# Altium footprint library Footprint_Library.PcbLib: 25 footprints (part 1 of 2)
Each footprint in its own frame and in the unit in brackets; x right, y up, seen from the top. Pads: shape width x height; smd on the part's side, far side on the other; paste and mask are expansions set on the pad; w line width, h text height; cw(c..) or ccw(c..) is an arc to the next point about the centre after c.
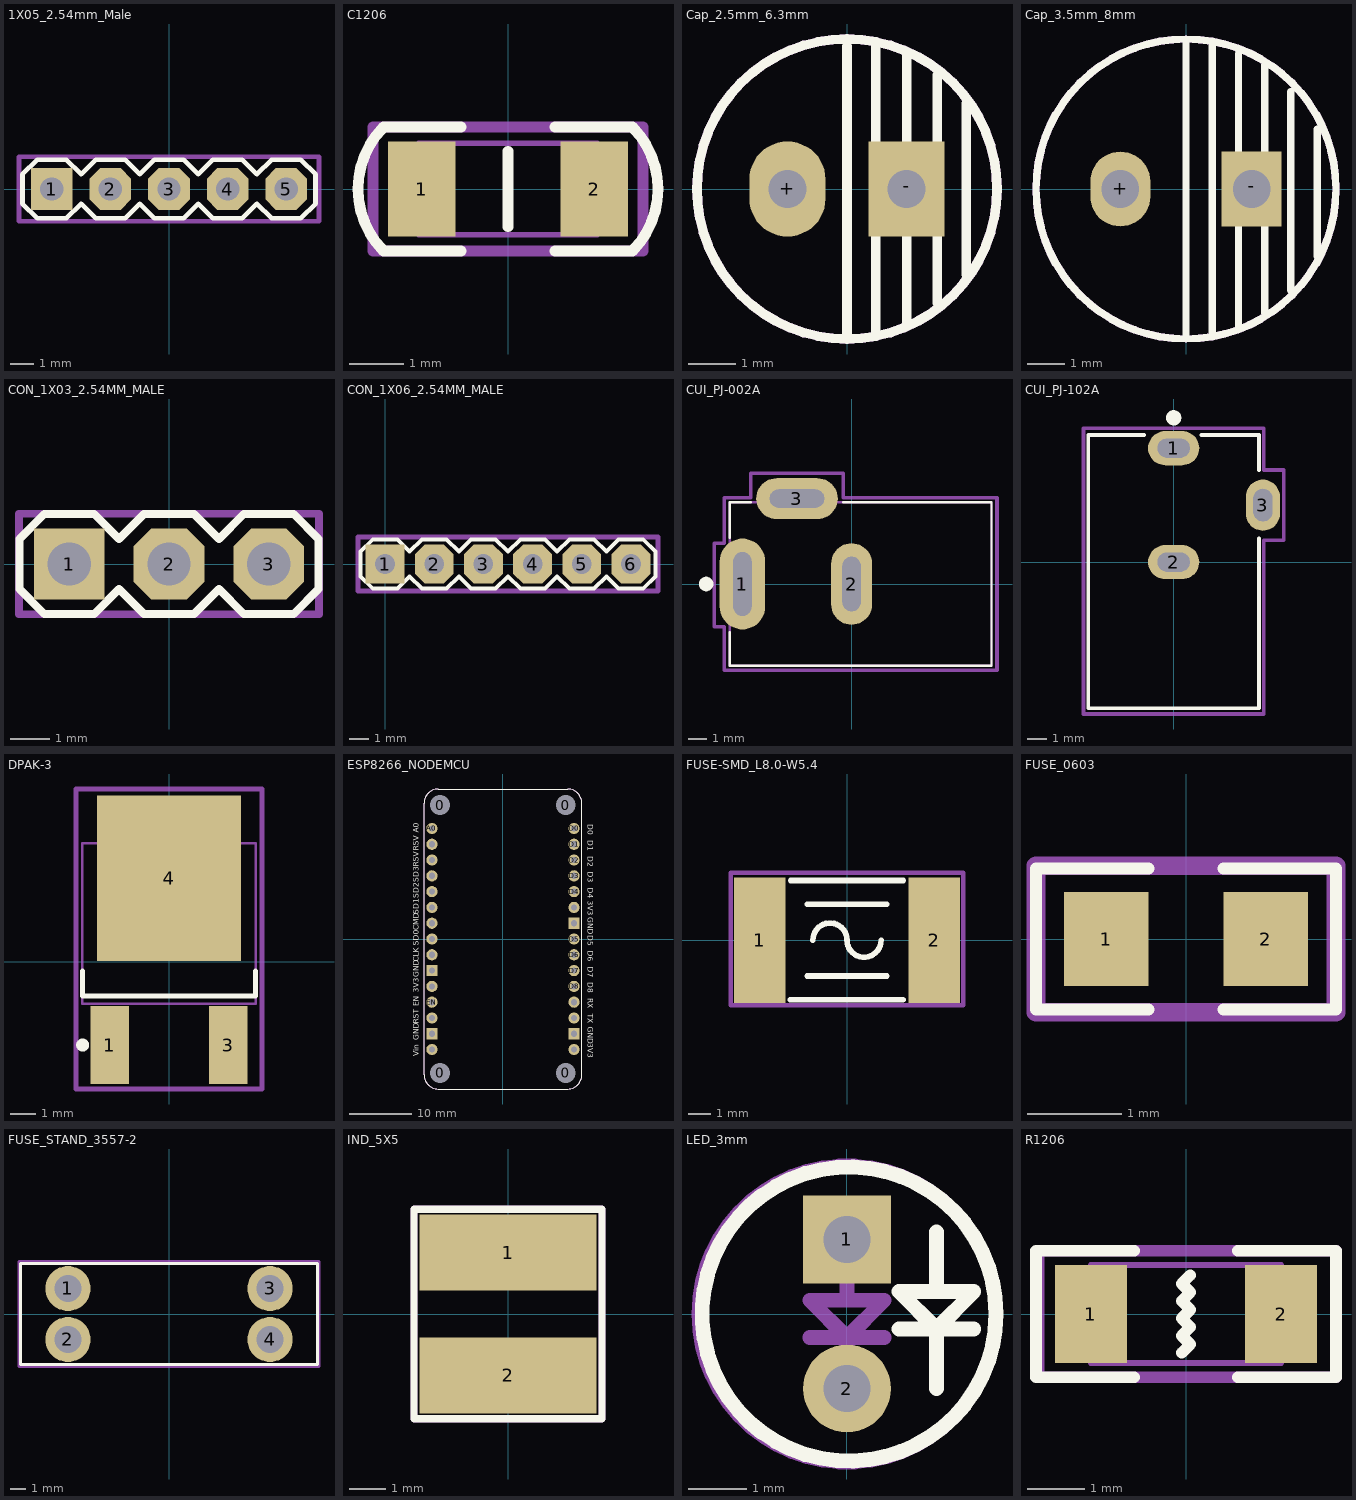
[diagram p0: the footprints below, top view; thin cyan lines are the x and y axes]

## 1X05_2.54mm_Male [mm]
pads (5):
  rect 1.8x1.8 hole 1.016: 1(-5.08,0)
  oct 1.8x1.8 hole 1.016: 2(-2.54,0) 3(0,0) 4(2.54,0) 5(5.08,0)
Top Overlay:
  lines w0.203: -6.35,-0.635 -6.35,0.635 -5.715,1.27 -4.445,1.27 -3.81,0.635 -3.175,1.27 -1.905,1.27 -1.27,0.635 -0.635,1.27 0.635,1.27 1.27,0.635 1.905,1.27 3.175,1.27 3.81,0.635 4.445,1.27 5.715,1.27 6.35,0.635 6.35,-0.635 5.715,-1.27 4.445,-1.27 3.81,-0.635 3.175,-1.27 1.905,-1.27 1.27,-0.635 0.635,-1.27 -0.635,-1.27 -1.27,-0.635 -1.905,-1.27 -3.175,-1.27 -3.81,-0.635 -4.445,-1.27 -5.715,-1.27 -6.35,-0.635
Mechanical 2:
  lines w0.2: -6.5,-1.4 6.5,-1.4 6.5,1.4 -6.5,1.4 -6.5,-1.4
  text "'.Designator'" at -4.1,-0.4 h1
Mechanical 16:
  rectangle: 4.826,-0.254 5.334,0.254
  rectangle: 2.286,-0.254 2.794,0.254
  rectangle: -0.254,-0.254 0.254,0.254
  rectangle: -2.794,-0.254 -2.286,0.254
  rectangle: -5.334,-0.254 -4.826,0.254
3D body "DS1021-1x5S61.stp": height 8.6, standoff -3, extent -6.35,-1.27 6.35,1.27

## C1206 [mm] "Chip Capacitor, 2-Leads, Body 3.20x1.60mm, IPC Medium Density"
height 0.6
pads (2):
  rect 1.25x1.75 smd: 1(-1.6,0) 2(1.6,0)
Top Overlay:
  lines w0.2: -0.87,-1.15 -2.3,-1.15 cw(c-1.15,0) -2.3,1.15 -0.87,1.15 ; 0,-0.7 0,0.7 ; 0.87,-1.15 2.3,-1.15 ccw(c1.15,0) 2.3,1.15 0.87,1.15
Mechanical 2:
  lines w0.2: -2.5,-1.15 -2.5,1.15 2.5,1.15 2.5,-1.15 -2.5,-1.15
  text "'.Designator'" at -1.65,-0.6 h1
Mechanical 13:
  lines w0.1: -1.65,-0.85 1.65,-0.85 1.65,0.85 -1.65,0.85 -1.65,-0.85
3D body "CAPC3216X06N.step": height 0.6, standoff 0, extent -1.65,-0.85 1.65,0.85

## Cap_2.5mm_6.3mm [mm]
pads (2):
  oval 1.6x2 hole 0.8: +(-1.25,0)
  rect 1.6x2 hole 0.8: -(1.25,0)
Top Overlay:
  circle w0.2: c0,0 r3.15
  lines w0.2: 0,-3.1 0,3 ; 0.6,-3 0.6,3 ; 1.25,-2.8 1.25,2.8 ; 1.9,-2.4 1.9,2.4 ; 2.5,-1.8 2.5,1.8
Mechanical 2:
  circle w0.2: c0,0 r3.15
  text "'.Designator'" at -2.5,1 h1
  text "+" at -1.7,-0.4 h1
3D body "Capacitor aluminum electrolytic radial 6,3x12mm 2,5mm pitch.STEP": height 12.11, standoff -2.9, extent -3.16,-3.15 3.15,3.15

## Cap_3.5mm_8mm [mm]
pads (2):
  oval 1.6x2 hole 1: +(-1.75,0)
  rect 1.6x2 hole 1: -(1.75,0)
Top Overlay:
  circle w0.2: c0,0 r4
  lines w0.2: 0,-3.9 0,3.9 ; 0.7,-3.8 0.7,3.8 ; 1.4,-3.7 1.4,3.6 ; 2.1,-3.3 2.1,3.3 ; 2.8,-2.7 2.8,2.6 ; 3.5,-1.8 3.5,1.6
Mechanical 2:
  circle w0.2: c0,0 r4
  text "'.Designator'" at -2.5,1 h1
  text "+" at -2.2,-0.4 h1
3D body "Capacitor aluminum electrolytic radial 8x18mm 3,5mm pitch.STEP": height 18.11, standoff -2.9, extent -4,-4 4.01,4

## CON_1X03_2.54MM_MALE [mm]
pads (3):
  rect 1.8x1.8 hole 1.1: 1(-2.54,0)
  oct 1.8x1.8 hole 1.1: 2(0,0) 3(2.54,0)
Top Overlay:
  lines w0.203: -3.81,-0.635 -3.175,-1.27 -1.905,-1.27 -1.27,-0.635 -0.635,-1.27 0.635,-1.27 1.27,-0.635 1.905,-1.27 3.175,-1.27 3.81,-0.635 3.81,0.635 3.175,1.27 1.905,1.27 1.27,0.635 0.635,1.27 -0.635,1.27 -1.27,0.635 -1.905,1.27 -3.175,1.27 -3.81,0.635 -3.81,-0.635
Mechanical 2:
  lines w0.2: -3.82,-1.28 -3.82,1.28 3.82,1.28 3.82,-1.28 -3.82,-1.28
  text "'.Designator'" at -2.9,-0.38 h1
3D body "DS1021-1x3S61.stp": height 8.6, standoff -3, extent -3.81,-1.27 3.81,1.27

## CON_1X06_2.54MM_MALE [mm]
pads (6):
  rect 2x2 hole 1.016: 1(0,0)
  oct 2x2 hole 1.016: 2(2.54,0) 3(5.08,0) 4(7.62,0) 5(10.16,0) 6(12.7,0)
Top Overlay:
  lines w0.203: -1.27,-0.635 -0.635,-1.27 0.635,-1.27 1.27,-0.635 1.905,-1.27 3.175,-1.27 3.81,-0.635 4.445,-1.27 5.715,-1.27 6.35,-0.635 6.985,-1.27 8.255,-1.27 8.89,-0.635 9.525,-1.27 10.795,-1.27 11.43,-0.635 12.065,-1.27 13.335,-1.27 13.97,-0.635 13.97,0.635 13.335,1.27 12.065,1.27 11.43,0.635 10.795,1.27 9.525,1.27 8.89,0.635 8.255,1.27 6.985,1.27 6.35,0.635 5.715,1.27 4.445,1.27 3.81,0.635 3.175,1.27 1.905,1.27 1.27,0.635 0.635,1.27 -0.635,1.27 -1.27,0.635 -1.27,-0.635
Mechanical 2:
  lines w0.254: -1.397,-1.397 14.097,-1.397 14.097,1.397 -1.397,1.397 -1.397,-1.397
  text "'.Designator'" at 2.235,-0.432 h1
3D body "DS1021-1x6S61.stp": height 8.6, standoff -3, extent -1.27,-1.27 13.97,1.27

## CUI_PJ-002A [mm] "Power Barrel Connector Jack 2.10mm ID (0.083\"), 5.50mm OD (0.217\") Through Hole, Right Angle"
pads (3):
  oval 2.5x5 hole 1 slot 3.5 at 90 deg: 1(-6,0)
  oval 2.25x4.5 hole 1 slot 3 at 90 deg: 2(0,0)
  oval 4.5x2.25 hole 1 slot 3 at 0 deg: 3(-3,4.7)
Top Overlay:
  circle w0.4: c-8,0 r0.2
  lines w0.127: -6.7,-2.65 -6.7,-4.5 7.7,-4.5 7.7,4.5 -0.45,4.5 ; -6.7,2.55 -6.7,4.5 -5.55,4.5
Mechanical 1:
  lines w0: -6.5,-1.75 -5.5,-1.75 -5.5,1.75 -6.5,1.75 -6.5,-1.75 ; -4.5,4.2 -4.5,5.2 -1.5,5.2 -1.5,4.2 -4.5,4.2 ; -0.5,-1.5 0.5,-1.5 0.5,1.5 -0.5,1.5 -0.5,-1.5
Mechanical 2:
  lines w0.2: -7.55,-2.35 -7.55,2.25 -7,2.25 -7,4.75 -5.55,4.75 -5.55,6.1 -0.45,6.1 -0.45,4.75 8,4.75 8,-4.75 -7,-4.75 -7,-2.35 -7.55,-2.35
  text "DC-JACK" at 7,-4.2 h2.25
  text "'.Designator'" at 2,-0.5 h1
Mechanical 13:
  lines w0.127: -6.7,-4.5 7.7,-4.5 ; -6.7,-4.5 7.7,-4.5 ; -6.7,-4.5 -6.7,4.5 ; -6.7,-4.5 -6.7,4.5 ; -6.7,4.5 7.7,4.5 ; -6.7,4.5 7.7,4.5 ; 7.7,-4.5 7.7,4.5 ; 7.7,-4.5 7.7,4.5
3D body "CUI_DEVICES_PJ-002A.step": height 11, standoff -3.5, extent -6.7,-4.5 7.7,4.9

## CUI_PJ-102A [mm] "Power Barrel Connector Jack 2.10mm ID (0.083\"), 5.50mm OD (0.217\") Through Hole, Right Angle"
pads (3):
  oval 2.7x1.8 hole 1 slot 1.7 at 0 deg: 1(0,6) 2(0,0)
  oval 1.8x2.7 hole 1 slot 1.7 at 90 deg: 3(4.7,3)
Top Overlay:
  circle w0.4: c0,7.6 r0.2
  lines w0.2: -1.55,6.7 -4.5,6.7 -4.5,-7.7 4.5,-7.7 4.5,1.25 ; 1.45,6.7 4.5,6.7 4.5,4.85
Mechanical 2:
  lines w0.2: -4.75,-8 -4.75,7.05 -2.35,7.05 2.25,7.05 4.75,7.05 4.75,4.85 5.8,4.85 5.8,1.15 4.75,1.15 4.75,-8 -4.75,-8
  text "'.Designator'" at -1.92,-3.57 h1
  text "DC-JACK" at -4.24,-7.03 h2.25
3D body "PJ-102AH--3DModel-STEP-56544.STEP": height 11, standoff -3.5, extent -4.5,-7.7 4.9,6.7

## DPAK-3 [mm] "D-PAK, 3-Pads, Body 6.20x6.72mm (max), IPC Medium Density"
height 2.38
pads (3):
  rect 1.5x3 smd: 1(-2.29,-3.225) 3(2.29,-3.225)
  rect 5.55x6.4 smd: 4(0,3.225)
Top Overlay:
  circle w0.25: c-3.34,-3.225 r0.125
  lines w0.2: -3.35,-0.375 -3.35,-1.325 3.35,-1.325 3.35,-0.375
Mechanical 2:
  lines w0.2: -3.6,-4.925 3.6,-4.925 3.6,6.675 -3.6,6.675 -3.6,-4.925
  text "'.Designator'" at 0,0 h1
Mechanical 13:
  lines w0.1: -3.35,-1.625 3.35,-1.625 3.35,4.575 -3.35,4.575 -3.35,-1.625
3D body "DPAK229P991X238-3N.step": height 2.38, standoff 0, extent -3.35,-3.695 3.35,6.21

## ESP8266_NODEMCU [mm] "NodeMCU v2 - Lua based ESP8266 development kit"
pads (34):
  round 2.921 hole 3.2 unplated paste-7.62 mask-7.62: 0(-10.1,-21.53) 0(-10.1,21.53) 0(10.1,-21.53) 0(10.1,21.53)
  round 1.8 hole 1: 3V3@1(-11.43,-7.62) 3V3@2(11.43,-17.78) 3V3@3(11.43,5.08) A0(-11.43,17.78) CLK(-11.43,-2.54) CMD(-11.43,2.54) D0(11.43,17.78) D1(11.43,15.24) D2(11.43,12.7) D3(11.43,10.16) D4(11.43,7.62) D5(11.43,0) D6(11.43,-2.54) D7(11.43,-5.08) D8(11.43,-7.62) EN(-11.43,-10.16) RST(-11.43,-12.7) RSV@1(-11.43,15.24) RSV@2(-11.43,12.7) RXD(11.43,-10.16) SD0(-11.43,0) SD1(-11.43,5.08) SD2(-11.43,7.62) SD3(-11.43,10.16) TXD(11.43,-12.7) VIN(-11.43,-17.78)
  rect 1.8x1.8 hole 1: GND@1(-11.43,-5.08) GND@2(-11.43,-15.24) GND@3(11.43,-15.24) GND@4(11.43,2.54)
Top Overlay:
  lines w0.2: 6.858,24.13 10.414,24.13 ; 10.414,24.13 cw(c10.414,21.844) 12.7,21.844 12.7,-21.844 cw(c10.414,-21.844) 10.414,-24.13 -10.414,-24.13 cw(c-10.414,-21.844) -12.7,-21.844 -12.7,21.844 cw(c-10.414,21.844) -10.414,24.13 10.414,24.13
  text "Vin" at -13.225,-18.821 h1.52
  text "GND" at -13.225,-16.281 h1.52
  text "RST" at -13.225,-13.665 h1.52
  text "EN" at -13.225,-10.82 h1.52
  text "3V3" at -13.225,-8.611 h1.52
  text "GND" at -13.225,-6.147 h1.52
  text "CLK" at -13.225,-3.658 h1.52
  text "SD0" at -13.225,-1.107 h1.52
  text "CMD" at -13.225,1.444 h1.52
  text "SD1" at -13.225,3.995 h1.52
  text "SD2" at -13.225,6.546 h1.52
  text "SD3" at -13.225,9.097 h1.52
  text "RSV" at -13.225,11.648 h1.52
  text "RSV" at -13.225,14.199 h1.52
  text "A0" at -13.225,17.094 h1.52
  text "D0" at 13.325,18.44 h1.52
  text "D1" at 13.325,15.866 h1.52
  text "D2" at 13.325,13.32 h1.52
  text "D3" at 13.325,10.78 h1.52
  text "D4" at 13.325,8.28 h1.52
  text "3V3" at 13.325,6.121 h1.52
  text "GND" at 13.325,3.531 h1.52
  text "D5" at 13.325,0.635 h1.52
  text "D6" at 13.325,-1.883 h1.52
  text "D7" at 13.325,-4.451 h1.52
  text "D8" at 13.325,-6.988 h1.52
  text "RX" at 13.325,-9.501 h1.52
  text "TX" at 13.325,-12.014 h1.52
  text "GND" at 13.325,-14.128 h1.52
  text "3V3" at 13.325,-16.764 h1.52
Mechanical 2:
  lines w0.2: 6.858,24.13 10.414,24.13 ; 10.414,24.13 cw(c10.414,21.844) 12.7,21.844 12.7,-21.844 cw(c10.414,-21.844) 10.414,-24.13 -10.414,-24.13 cw(c-10.414,-21.844) -12.7,-21.844 -12.7,21.844 cw(c-10.414,21.844) -10.414,24.13 10.414,24.13
  text "D0" at 13.325,18.44 h1.52
  text "D1" at 13.325,15.866 h1.52
  text "D2" at 13.325,13.32 h1.52
  text "D3" at 13.325,10.78 h1.52
  text "D4" at 13.325,8.28 h1.52
  text "3V3" at 13.325,6.121 h1.52
  text "GND" at 13.325,3.531 h1.52
  text "D5" at 13.325,0.635 h1.52
  text "D6" at 13.325,-1.883 h1.52
  text "D7" at 13.325,-4.451 h1.52
  text "D8" at 13.325,-6.988 h1.52
  text "RX" at 13.325,-9.501 h1.52
  text "TX" at 13.325,-12.014 h1.52
  text "GND" at 13.325,-14.128 h1.52
  text "3V3" at 13.325,-16.764 h1.52
  text "Vin" at -13.225,-18.821 h1.52
  text "GND" at -13.225,-16.281 h1.52
  text "RST" at -13.225,-13.665 h1.52
  text "EN" at -13.225,-10.82 h1.52
  text "3V3" at -13.225,-8.611 h1.52
  text "GND" at -13.225,-6.147 h1.52
  text "CLK" at -13.225,-3.658 h1.52
  text "SD0" at -13.225,-1.107 h1.52
  text "CMD" at -13.225,1.444 h1.52
  text "SD1" at -13.225,3.995 h1.52
  text "SD2" at -13.225,6.546 h1.52
  text "SD3" at -13.225,9.097 h1.52
  text "RSV" at -13.225,11.648 h1.52
  text "RSV" at -13.225,14.199 h1.52
  text "A0" at -13.225,17.094 h1.52
  text "'.Designator'" at -4.8,-1.7 h1
3D body "NODEMCU_DEVKIT_V1.0.step": height 14.77, standoff 2.58, extent -12.87,-24.727 12.91,24.267
3D body "SSQ-115-03-T-S.stp": height 20.01, standoff 1.49, extent -12.627,-19.28 -10.213,19.328
3D body "SSQ-115-03-T-S.stp": height 20.01, standoff 1.49, extent 10.233,-19.28 12.647,19.328
3D body "female_header_a-bl254-eg-g15d.stp": height 8.5, standoff -3.2, extent 10.18,-19.2 12.68,19.15
3D body "female_header_a-bl254-eg-g15d.stp": height 8.5, standoff -3.2, extent -12.68,-19.2 -10.18,19.15

## FUSE-SMD_L8.0-W5.4 [mm]
pads (2):
  rect 2.3x5.6 smd: 1(-3.9,0) 2(3.9,0)
Top Overlay:
  lines w0.254: -2.54,-2.667 2.498,-2.667 ; -2.519,2.667 2.519,2.667 ; -1.769,-1.6 1.769,-1.6 ; -1.769,1.6 1.769,1.6 ; -1.524,0 cw(c-0.762,0) 0,0 ccw(c0.762,0) 1.524,0
Mechanical 2:
  lines w0.2: -5.2,-2.9 -5.2,3 5.2,3 5.2,-2.9 -5.2,-2.9
  text "'.Designator'" at -3,-0.5 h1
3D body "User Library-Fuse 2920.step": height 0.9, standoff 0, extent -3.68,-2.56 3.68,2.56

## FUSE_0603 [mm]
pads (2):
  rect 0.9x1 smd: 1(-0.85,0) 2(0.85,0)
Top Overlay:
  lines w0.127: -0.4,-0.75 -1.6,-0.75 -1.6,0.75 -0.4,0.75 ; 0.4,-0.75 1.6,-0.75 1.6,0.75 0.4,0.75
Mechanical 2:
  lines w0.2: -1.6,-0.78 -1.6,0.78 1.6,0.78 1.6,-0.78 -1.6,-0.78
  text "'.Designator'" at -1.39,-0.56 h1
3D body "User Library-MF-FSMF020X_FUSE0603.step": height 0.53, standoff 0, extent -0.825,-0.425 0.825,0.425

## FUSE_STAND_3557-2 [mm]
pads (4):
  round 3 hole 1.8: 1(-6.735,1.7) 2(-6.735,-1.7) 3(6.735,1.7) 4(6.735,-1.7)
Top Overlay:
  lines w0.2: -9.905,-3.365 9.905,-3.365 9.905,3.365 -9.905,3.365 -9.905,-3.365
Mechanical 2:
  lines w0.2: -10,-3.5 10,-3.5 10,3.5 -10,3.5 -10,-3.5
  text "'.Designator'" at -3,-0.5 h1
3D body "User Library-keystone-PN3557-2.SLDPRT": height 8.04, standoff -2.12, extent -9.894,-3.377 9.918,3.354

## IND_5X5 [mm]
pads (2):
  rect 4.9x2.1 smd: 1(0,1.7) 2(0,-1.7)
Top Overlay:
  lines w0.2: -2.6,-2.9 2.6,-2.9 2.6,2.9 -2.6,2.9 -2.6,-2.9
Mechanical 2:
  lines w0.2: -2.6,-2.9 2.6,-2.9 2.6,2.9 -2.6,2.9 -2.6,-2.9
  text "'.Designator'" at -1.4,-1.3 h1
3D body "User Library-Inductor VLCF5020T-100M1R1-1.step": height 2.95, standoff 0, extent -2.5,-2.5 2.5,2.5

## LED_3mm [mm]
pads (2):
  rect 1.5x1.5 hole 0.8: 1(0,1.27)
  round 1.5 hole 0.8: 2(0,-1.27)
Top Overlay:
  circle w0.254: c0.035,0 r2.505
  lines w0.254: 0.889,-0.254 1.524,-0.254 ; 1.524,-1.27 1.524,-0.254 ; 1.524,0.381 1.524,1.397 ; 2.159,-0.254 1.524,-0.254 ; 1.524,-0.254 0.889,0.381 2.159,0.381 1.524,-0.254
Mechanical 1:
  circle w0.025: c0,0 r2.556
Mechanical 2:
  circle w0.2: c0,0 r2.55
  lines w0.254: -0.635,-0.4 0,-0.4 ; 0,-1 0,-0.4 ; 0,0.235 0,0.9 ; 0.635,-0.4 0,-0.4 ; 0,-0.4 0.635,0.235 -0.635,0.235 0,-0.4
  text "'.Designator'" at 1,1.3 h1
3D body "LED 3mm.STEP": height 5.38, standoff -3.17, extent -1.994,-1.994 1.499,1.994

## R1206 [mm] "Chip Resistor, 2-Leads, Body 3.20x1.60mm, IPC Medium Density"
height 0.6
pads (2):
  rect 1.25x1.7 smd: 1(-1.65,0) 2(1.65,0)
Top Overlay:
  lines w0.2: -0.9,-1.1 -2.6,-1.1 -2.6,1.1 -0.9,1.1 ; -0.075,-0.675 0.075,-0.525 -0.075,-0.375 0.075,-0.225 -0.075,-0.075 0.075,0.075 -0.075,0.225 0.075,0.375 -0.075,0.525 0.075,0.675 ; 0.9,-1.1 2.6,-1.1 2.6,1.1 0.9,1.1
Mechanical 2:
  lines w0.2: -2.55,-1.1 -2.55,1.1 2.6,1.1 2.6,-1.1 -2.55,-1.1
  text "'.Designator'" at -1.9,-0.6 h1
Mechanical 13:
  lines w0.1: -1.65,-0.85 -1.65,0.85 1.65,0.85 1.65,-0.85 -1.65,-0.85
3D body "RESC3216X06N.step": height 0.6, standoff 0, extent -1.65,-0.85 1.65,0.85